# Altium footprint library ICs And Semiconductors SMD.PcbLib: 943 footprints (part 54 of 60)
Each footprint in its own frame and in the unit in brackets; x right, y up, seen from the top. Pads: shape width x height; smd on the part's side, far side on the other; paste and mask are expansions set on the pad; w line width, h text height; cw(c..) or ccw(c..) is an arc to the next point about the centre after c.
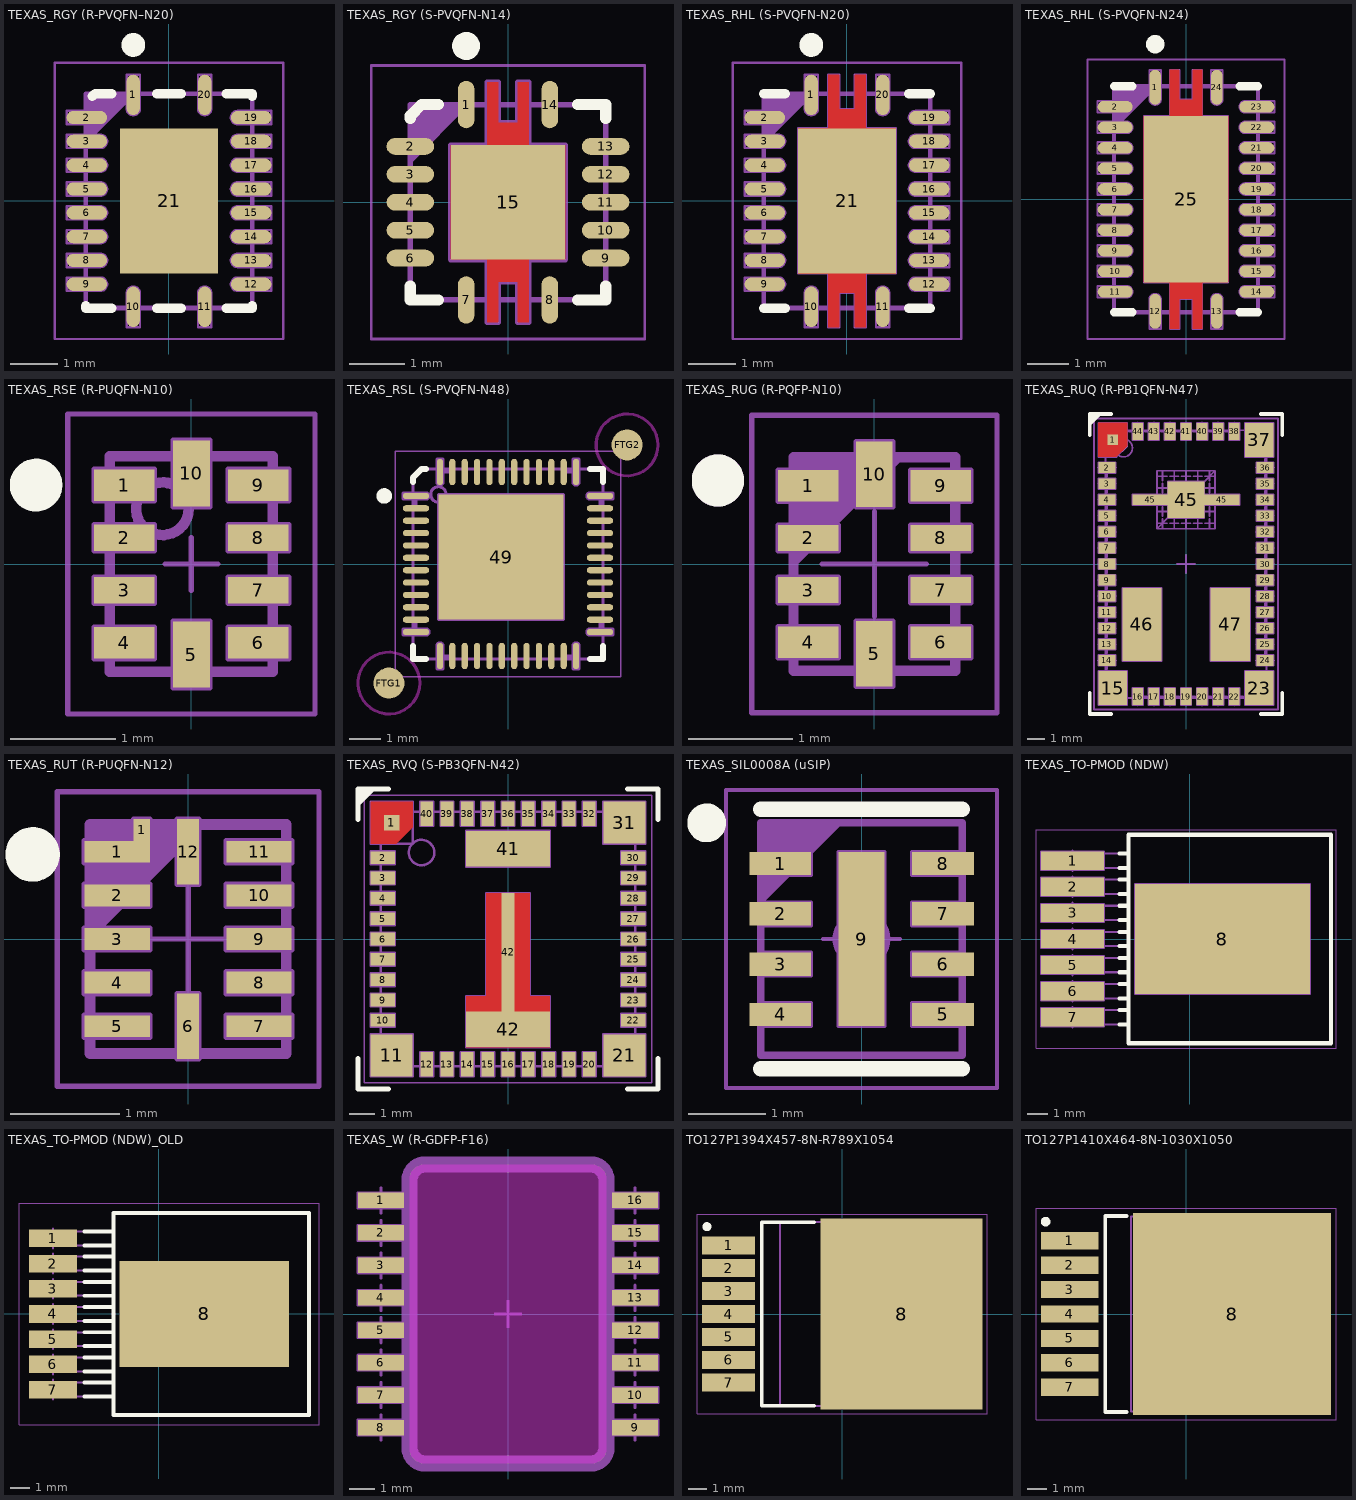
[diagram p53: the footprints below, top view; thin cyan lines are the x and y axes]

## TEXAS_RGY (R-PVQFN–N20) [mm] "TEXAS Case Style RGY (R-PVQFN–N24), QFN, 0.50mm Pitch, Rectangular; 20 Pin, 4.50mm L X 3.50mm W X 1mm H body (w/thermal tab 3.15 X 2.15mm)"
height 1
pads (21):
  oval 0.28x0.85 smd: 1(-0.75,2.225) 10(-0.75,-2.225) 11(0.75,-2.225) 20(0.75,2.225)
  oval 0.85x0.28 smd: 2(-1.725,1.75) 3(-1.725,1.25) 4(-1.725,0.75) 5(-1.725,0.25) 6(-1.725,-0.25) 7(-1.725,-0.75) 8(-1.725,-1.25) 9(-1.725,-1.75) 12(1.725,-1.75) 13(1.725,-1.25) 14(1.725,-0.75) 15(1.725,-0.25) 16(1.725,0.25) 17(1.725,0.75) 18(1.725,1.25) 19(1.725,1.75)
  rect 2.05x3.05 smd: 21(0,0)
Top Overlay:
  circle w0.25: c-0.75,3.275 r0.125
  lines w0.2: -1.75,-2.2 -1.75,-2.25 -1.2,-2.25 ; -1.61,2.2 -1.55,2.25 -1.2,2.25 ; -0.26,-2.25 0.26,-2.25 ; -0.26,2.25 0.26,2.25 ; 1.2,-2.25 1.75,-2.25 1.75,-2.2 ; 1.2,2.25 1.75,2.25 1.75,2.2
Mechanical 8:
  drawing of 164 lines, arcs and shapes, not listed
Mechanical 14:
  lines w0.1: -1.75,1.25 -0.75,2.25 ; -1.75,1.35 -0.85,2.25 ; -1.75,1.45 -0.95,2.25 ; -1.75,1.55 -1.05,2.25 ; -1.75,1.65 -1.15,2.25 ; -1.75,1.75 -1.25,2.25 ; -1.75,1.85 -1.35,2.25 ; -1.75,1.95 -1.45,2.25 ; -1.75,2.05 -1.55,2.25 ; -1.75,2.15 -1.65,2.25 ; -1.75,-2.25 -1.75,2.25 1.75,2.25 1.75,-2.25 -1.75,-2.25
Mechanical 15:
  lines w0.05: -2.4,-2.9 -2.4,2.9 2.4,2.9 2.4,-2.9 -2.4,-2.9
3D body "TEXAS_RGY (R-PVQFN–N20).stp": height 1, standoff 0, extent -1.75,-2.25 1.75,2.25

## TEXAS_RGY (S-PVQFN-N14) [mm] "PSON, JEDEC MO-241BA, TEXAS RGY (S-PVQFN–N14), 0.50mm Pitch, Square; 5 Pin X 4 Pin, 3.5mm X 3.5mm X 1.00mm H body (w/thermal tab 2.05 X 2.05mm)"
height 1
pads (15):
  oval 0.3x0.85 smd: 1(-0.75,1.75) 7(-0.75,-1.75) 8(0.75,-1.75) 14(0.75,1.75)
  oval 0.85x0.3 smd: 2(-1.75,1) 3(-1.75,0.5) 4(-1.75,0) 5(-1.75,-0.5) 6(-1.75,-1) 9(1.75,-1) 10(1.75,-0.5) 11(1.75,0) 12(1.75,0.5) 13(1.75,1)
  rect 2.05x2.05 smd: 15(0,0)
Top Layer:
  region: -1.025,1.025 -0.375,1.025 -0.375,2.15 -0.175,2.15 -0.175,1.425 0.175,1.425 0.175,2.15 0.375,2.15 0.375,1.025 1.025,1.025 1.025,-1.025 0.375,-1.025 0.375,-2.15 0.175,-2.15 0.175,-1.425 -0.175,-1.425 -0.175,-2.15 -0.375,-2.15 -0.375,-1.025 -1.025,-1.025
Top Overlay:
  circle w0.25: c-0.75,2.8 r0.125
  lines w0.2: -1.75,-1.5 -1.75,-1.75 -1.25,-1.75 ; -1.75,1.5 -1.75,1.55 -1.55,1.75 -1.25,1.75 ; 1.25,-1.75 1.75,-1.75 1.75,-1.5 ; 1.25,1.75 1.75,1.75 1.75,1.5
Mechanical 8:
  lines w0.1: -1,0 0,0 ; 0,-1 0,0 ; 0,1 0,0 ; 1,0 0,0 ; -1.025,-1.025 -1.025,1.025 -0.375,1.025 -0.375,2.15 -0.175,2.15 -0.175,1.425 0.175,1.425 0.175,2.15 0.375,2.15 0.375,1.025 1.025,1.025 1.025,-1.025 0.375,-1.025 0.375,-2.15 0.175,-2.15 0.175,-1.425 -0.175,-1.425 -0.175,-2.15 -0.375,-2.15 -0.375,-1.025 -1.025,-1.025
Mechanical 14:
  lines w0.1: -1.75,0.75 -0.75,1.75 ; -1.75,0.85 -0.85,1.75 ; -1.75,0.95 -0.95,1.75 ; -1.75,1.05 -1.05,1.75 ; -1.75,1.15 -1.15,1.75 ; -1.75,1.25 -1.25,1.75 ; -1.75,1.35 -1.35,1.75 ; -1.75,1.45 -1.45,1.75 ; -1.75,1.55 -1.55,1.75 ; -1.75,1.65 -1.65,1.75 ; -1.75,-1.75 -1.75,1.75 1.75,1.75 1.75,-1.75 -1.75,-1.75
Mechanical 15:
  lines w0.05: -0.5,0 0.5,0 ; 0,-0.5 0,0.5 ; -2.45,-2.45 -2.45,2.45 2.45,2.45 2.45,-2.45 -2.45,-2.45
3D body "TEXAS_RGY (S-PVQFN–N14).stp": height 1, standoff 0, extent -1.825,-1.825 1.825,1.825

## TEXAS_RHL (S-PVQFN-N20) [mm] "TEXAS Case Style RHL (S-PVQFN-N20), QFN, 0.50mm Pitch, Rectangular; 20 Pin, 4.50mm L X 3.50mm W X 1mm H body (w/thermal tab 3.05 X 2.05mm)"
height 1
pads (21):
  oval 0.28x0.85 smd: 1(-0.75,2.225) 10(-0.75,-2.225) 11(0.75,-2.225) 20(0.75,2.225)
  oval 0.85x0.28 smd: 2(-1.725,1.75) 3(-1.725,1.25) 4(-1.725,0.75) 5(-1.725,0.25) 6(-1.725,-0.25) 7(-1.725,-0.75) 8(-1.725,-1.25) 9(-1.725,-1.75) 12(1.725,-1.75) 13(1.725,-1.25) 14(1.725,-0.75) 15(1.725,-0.25) 16(1.725,0.25) 17(1.725,0.75) 18(1.725,1.25) 19(1.725,1.75)
  rect 2.05x3.05 smd: 21(0,0)
Top Layer:
  region: -0.39,-2.65 -0.39,-1.525 -1.025,-1.525 -1.025,1.525 -0.39,1.525 -0.39,2.65 -0.16,2.65 -0.16,1.925 0.16,1.925 0.16,2.65 0.39,2.65 0.39,1.525 1.025,1.525 1.025,-1.525 0.39,-1.525 0.39,-2.65 0.16,-2.65 0.16,-1.925 -0.16,-1.925 -0.16,-2.65
Top Overlay:
  circle w0.25: c-0.75,3.275 r0.125
  lines w0.2: -1.75,-2.25 -1.3,-2.25 ; -1.75,2.25 -1.3,2.25 ; 1.3,-2.25 1.75,-2.25 ; 1.3,2.25 1.75,2.25
Mechanical 8:
  drawing of 184 lines, arcs and shapes, not listed
Mechanical 14:
  lines w0.1: -1.75,1.25 -0.75,2.25 ; -1.75,1.35 -0.85,2.25 ; -1.75,1.45 -0.95,2.25 ; -1.75,1.55 -1.05,2.25 ; -1.75,1.65 -1.15,2.25 ; -1.75,1.75 -1.25,2.25 ; -1.75,1.85 -1.35,2.25 ; -1.75,1.95 -1.45,2.25 ; -1.75,2.05 -1.55,2.25 ; -1.75,2.15 -1.65,2.25 ; -1.75,-2.25 1.75,-2.25 1.75,2.25 -1.75,2.25 -1.75,-2.25
Mechanical 15:
  lines w0.05: -2.4,-2.9 2.4,-2.9 2.4,2.9 -2.4,2.9 -2.4,-2.9
3D body "TEXAS_RHL (S-PVQFN-N20).stp": height 1, standoff 0, extent -1.75,-2.25 1.75,2.25

## TEXAS_RHL (S-PVQFN-N24) [mm] "TEXAS Case Style RHL (S-PVQFN-N24), QFN, 0.50mm Pitch, Rectangular; 24 Pin, 5.50mm L X 3.50mm W X 1mm H body (w/thermal tab 4.05 X 2.05mm)"
height 1
pads (25):
  oval 0.28x0.85 smd: 1(-0.75,2.725) 12(-0.75,-2.725) 13(0.75,-2.725) 24(0.75,2.725)
  oval 0.85x0.28 smd: 2(-1.725,2.25) 3(-1.725,1.75) 4(-1.725,1.25) 5(-1.725,0.75) 6(-1.725,0.25) 7(-1.725,-0.25) 8(-1.725,-0.75) 9(-1.725,-1.25) 10(-1.725,-1.75) 11(-1.725,-2.25) 14(1.725,-2.25) 15(1.725,-1.75) 16(1.725,-1.25) 17(1.725,-0.75) 18(1.725,-0.25) 19(1.725,0.25) 20(1.725,0.75) 21(1.725,1.25) 22(1.725,1.75) 23(1.725,2.25)
  rect 2.05x4.05 smd: 25(0,0)
Top Layer:
  region: -0.39,-3.15 -0.39,-2.025 -1.025,-2.025 -1.025,2.025 -0.39,2.025 -0.39,3.15 -0.16,3.15 -0.16,2.425 0.16,2.425 0.16,3.15 0.39,3.15 0.39,2.025 1.025,2.025 1.025,-2.025 0.39,-2.025 0.39,-3.15 0.16,-3.15 0.16,-2.425 -0.16,-2.425 -0.16,-3.15
Top Overlay:
  circle w0.2: c-0.75,3.775 r0.125
  lines w0.2: -1.75,-2.75 -1.3,-2.75 ; -1.75,2.75 -1.3,2.75 ; -0.75,3.875 -0.75,3.775 -0.65,3.775 ; 1.3,-2.75 1.75,-2.75 ; 1.3,2.75 1.75,2.75
Mechanical 8:
  drawing of 216 lines, arcs and shapes, not listed
Mechanical 14:
  lines w0.1: -1.75,1.75 -0.75,2.75 ; -1.75,1.85 -0.85,2.75 ; -1.75,1.95 -0.95,2.75 ; -1.75,2.05 -1.05,2.75 ; -1.75,2.15 -1.15,2.75 ; -1.75,2.25 -1.25,2.75 ; -1.75,2.35 -1.35,2.75 ; -1.75,2.45 -1.45,2.75 ; -1.75,2.55 -1.55,2.75 ; -1.75,2.65 -1.65,2.75 ; -1.75,-2.75 1.75,-2.75 1.75,2.75 -1.75,2.75 -1.75,-2.75
Mechanical 15:
  lines w0.05: -2.4,-3.4 2.4,-3.4 2.4,3.4 -2.4,3.4 -2.4,-3.4
3D body "TEXAS_RHL (S-PVQFN-N24).stp": height 1, standoff 0, extent -1.75,-2.75 1.75,2.75

## TEXAS_RSE (R-PUQFN-N10) [mm] "QFN, 10-Leads, Body 1.5x2mm, Pitch 0.50mm, IPC Medium Density"
height 0.6
pads (10):
  rect 0.575x0.3 smd: 1(-0.637,0.75) 4(-0.637,-0.75) 6(0.637,-0.75) 9(0.637,0.75)
  rect 0.575x0.25 smd: 2(-0.637,0.25) 3(-0.637,-0.25) 7(0.637,-0.25) 8(0.637,0.25)
  rect 0.35x0.63 smd: 5(0,-0.86) 10(0,0.86)
Top Overlay:
  circle w0.25: c-1.475,0.75 r0.125
Mechanical 8:
  lines w0.05: -0.25,0 0,0 ; 0,-0.25 0,0 ; 0,0.25 0,0 ; 0.25,0 0,0 ; -0.925,-0.9 -0.925,-0.6 ; -0.925,-0.9 -0.35,-0.9 -0.35,-0.6 -0.925,-0.6 ; -0.925,-0.9 -0.637,-0.75 -0.925,-0.6 ; -0.925,-0.375 -0.35,-0.375 -0.35,-0.125 -0.925,-0.125 ; -0.925,-0.375 -0.925,-0.125 ; -0.925,-0.375 -0.637,-0.25 -0.925,-0.125 ; -0.925,0.125 -0.35,0.125 -0.35,0.375 -0.925,0.375 ; -0.925,0.125 -0.925,0.375 ; -0.925,0.125 -0.637,0.25 -0.925,0.375 ; -0.925,0.6 -0.925,0.9 ; -0.925,0.6 -0.35,0.6 -0.35,0.9 -0.925,0.9 ; -0.925,0.6 -0.637,0.75 -0.925,0.9 ; -0.175,-1.175 -0.175,-0.545 0.175,-0.545 0.175,-1.175 ; -0.175,-1.175 0.175,-1.175 ; -0.175,-1.175 0,-0.86 0.175,-1.175 ; -0.175,1.175 -0.175,0.545 0.175,0.545 0.175,1.175 ; -0.175,1.175 0.175,1.175 ; -0.175,1.175 0,0.86 0.175,1.175 ; 0.925,-0.9 0.925,-0.6 ; 0.925,-0.9 0.35,-0.9 0.35,-0.6 0.925,-0.6 ; 0.925,-0.9 0.637,-0.75 0.925,-0.6 ; 0.925,-0.375 0.925,-0.125 ; 0.925,-0.375 0.35,-0.375 0.35,-0.125 0.925,-0.125 ; 0.925,-0.375 0.925,-0.125 ; 0.925,-0.375 0.637,-0.25 0.925,-0.125 ; 0.925,0.125 0.925,0.375 ; 0.925,0.125 0.35,0.125 0.35,0.375 0.925,0.375 ; 0.925,0.125 0.925,0.375 ; 0.925,0.125 0.637,0.25 0.925,0.375 ; 0.925,0.6 0.925,0.9 ; 0.925,0.6 0.35,0.6 0.35,0.9 0.925,0.9 ; 0.925,0.6 0.637,0.75 0.925,0.9
Mechanical 14:
  circle w0.1: c-0.275,0.525 r0.25
  lines w0.1: -0.775,-1.025 0.775,-1.025 0.775,1.025 -0.775,1.025 -0.775,-1.025
Mechanical 15:
  lines w0.05: -1.175,-1.425 -1.175,1.425 1.175,1.425 1.175,-1.425 -1.175,-1.425
3D body "TEXAS_RSE (R-PUQFN-N10).stp": height 0.6, standoff 0, extent -0.775,-1.025 0.775,1.025

## TEXAS_RSL (S-PVQFN-N48) [mm] "TEXAS Case Style RSL, QFN, 0.40mm Pitch, Square; 48 Pin, 6.00mm L X 6.00mm W X 1.00mm H body (w/thermal tab 4.05 X 4.05mm)"
height 1
pads (51):
  oval 0.85x0.2 smd: 1(-2.975,2.2) 2(-2.975,1.8) 3(-2.975,1.4) 4(-2.975,1) 5(-2.975,0.6) 6(-2.975,0.2) 7(-2.975,-0.2) 8(-2.975,-0.6) 9(-2.975,-1) 10(-2.975,-1.4) 11(-2.975,-1.8) 12(-2.975,-2.2) 25(2.975,-2.2) 26(2.975,-1.8) 27(2.975,-1.4) 28(2.975,-1) 29(2.975,-0.6) 30(2.975,-0.2) 31(2.975,0.2) 32(2.975,0.6) 33(2.975,1) 34(2.975,1.4) 35(2.975,1.8) 36(2.975,2.2)
  oval 0.2x0.85 smd: 13(-2.2,-2.975) 14(-1.8,-2.975) 15(-1.4,-2.975) 16(-1,-2.975) 17(-0.6,-2.975) 18(-0.2,-2.975) 19(0.2,-2.975) 20(0.6,-2.975) 21(1,-2.975) 22(1.4,-2.975) 23(1.8,-2.975) 24(2.2,-2.975) 37(2.2,2.975) 38(1.8,2.975) 39(1.4,2.975) 40(1,2.975) 41(0.6,2.975) 42(0.2,2.975) 43(-0.2,2.975) 44(-0.6,2.975) 45(-1,2.975) 46(-1.4,2.975) 47(-1.8,2.975) 48(-2.2,2.975)
  rect 4.05x4.05 smd: 49(-0.225,0.225)
  round 1 smd paste-0.51 mask+0.5: FTG1(-3.85,-3.85) FTG2(3.85,3.85)
Top Layer keep-out:
  circle w0.1: c-3.85,-3.85 r1
  circle w0.1: c3.85,3.85 r1
Top Overlay:
  circle w0.25: c-4,2.2 r0.125
  lines w0.2: -3.075,-2.65 -3.075,-3.075 -2.65,-3.075 ; -3.075,2.65 -3.075,2.795 -2.795,3.075 -2.65,3.075 ; 2.65,-3.075 3.075,-3.075 3.075,-2.65 ; 2.65,3.075 3.075,3.075 3.075,2.65
Top Paste:
  region: 0.65,1.1 0.65,2.25 1.8,2.25 1.8,1.1
  region: 0.65,-0.35 0.65,0.8 1.8,0.8 1.8,-0.35
  region: 0.65,-1.8 0.65,-0.65 1.8,-0.65 1.8,-1.8
  region: -0.8,-1.8 -0.8,-0.65 0.35,-0.65 0.35,-1.8
  region: -2.25,-1.8 -2.25,-0.65 -1.1,-0.65 -1.1,-1.8
  region: -2.25,-0.35 -2.25,0.8 -1.1,0.8 -1.1,-0.35
  region: -0.8,-0.35 -0.8,0.8 0.35,0.8 0.35,-0.35
  region: -0.8,1.1 -0.8,2.25 0.35,2.25 0.35,1.1
  region: -2.25,1.1 -2.25,2.25 -1.1,2.25 -1.1,1.1
Mechanical 8:
  lines w0.1: -3.4,-2.2 -2.975,-2.2 ; -3.4,2.2 -2.975,2.2 ; -2.975,-1.8 -2.975,-2.2 ; -2.975,1.8 -2.975,2.2 ; -2.55,-2.2 -2.975,-2.2 ; -2.55,2.2 -2.975,2.2 ; -2.2,-3.4 -2.2,-2.975 ; -2.2,-2.55 -2.2,-2.975 ; -2.2,2.55 -2.2,2.975 ; -2.2,3.4 -2.2,2.975 ; -2.079,-1.629 -1.725,-1.275 ; -2.079,-0.921 -1.725,-1.275 ; -2.079,-0.629 -1.725,-0.275 ; -2.079,0.079 -1.725,-0.275 ; -2.079,0.371 -1.725,0.725 ; -2.079,1.079 -1.725,0.725 ; -2.079,1.371 -1.725,1.725 ; -2.079,2.079 -1.725,1.725 ; -1.8,-2.975 -2.2,-2.975 ; -1.8,2.975 -2.2,2.975 ; -1.371,-1.629 -1.725,-1.275 ; -1.371,-0.921 -1.725,-1.275 ; -1.371,-0.629 -1.725,-0.275 ; -1.371,0.079 -1.725,-0.275 ; -1.371,0.371 -1.725,0.725 ; -1.371,1.079 -1.725,0.725 ; -1.371,1.371 -1.725,1.725 ; -1.371,2.079 -1.725,1.725 ; -1.079,-1.629 -0.725,-1.275 ; -1.079,-0.921 -0.725,-1.275 ; -1.079,-0.629 -0.725,-0.275 ; -1.079,0.079 -0.725,-0.275 ; -1.079,0.371 -0.725,0.725 ; -1.079,1.079 -0.725,0.725 ; -1.079,1.371 -0.725,1.725 ; -1.079,2.079 -0.725,1.725 ; -0.725,0.225 -0.225,0.225 -0.225,0.725 ; -0.5,0 0,0 ; -0.371,-1.629 -0.725,-1.275 ; -0.371,-0.921 -0.725,-1.275 ; -0.371,-0.629 -0.725,-0.275 ; -0.371,1.079 -0.725,0.725 ; -0.371,1.371 -0.725,1.725 ; -0.371,2.079 -0.725,1.725 ; -0.079,-1.629 0.275,-1.275 ; -0.079,-0.921 0.275,-1.275 ; -0.079,-0.629 0.275,-0.275 ; -0.079,1.079 0.275,0.725 ; -0.079,1.371 0.275,1.725 ; -0.079,2.079 0.275,1.725 ; 0,-0.5 0,0 ; 0,0.5 0,0 ; 0.5,0 0,0 ; 0.629,-1.629 0.275,-1.275 ; 0.629,-0.921 0.275,-1.275 ; 0.629,-0.629 0.275,-0.275 ; 0.629,0.079 0.275,-0.275 ; 0.629,0.371 0.275,0.725 ; 0.629,1.079 0.275,0.725 ; 0.629,1.371 0.275,1.725 ; 0.629,2.079 0.275,1.725 ; 0.921,-1.629 1.275,-1.275 ; 0.921,-0.921 1.275,-1.275 ; 0.921,-0.629 1.275,-0.275 ; 0.921,0.079 1.275,-0.275 ; 0.921,0.371 1.275,0.725 ; 0.921,1.079 1.275,0.725 ; 0.921,1.371 1.275,1.725 ; 0.921,2.079 1.275,1.725 ; 1.629,-1.629 1.275,-1.275 ; 1.629,-0.921 1.275,-1.275 ; 1.629,-0.629 1.275,-0.275 ; 1.629,0.079 1.275,-0.275 ; 1.629,0.371 1.275,0.725 ; 1.629,1.079 1.275,0.725 ; 1.629,1.371 1.275,1.725 ; 1.629,2.079 1.275,1.725 ; 1.8,-2.975 2.2,-2.975 ; 1.8,2.975 2.2,2.975 ; 2.2,-3.4 2.2,-2.975 ; 2.2,-2.55 2.2,-2.975 ; 2.2,2.55 2.2,2.975 ; 2.2,3.4 2.2,2.975 ; 2.55,-2.2 2.975,-2.2 ; 2.55,2.2 2.975,2.2 ; 2.975,-1.8 2.975,-2.2 ; 2.975,1.8 2.975,2.2 ; 3.4,-2.2 2.975,-2.2 ; 3.4,2.2 2.975,2.2 ; -3.4,-2.3 -2.65,-2.3 ccw(c-2.65,-2.2) -2.65,-2.1 -3.4,-2.1 -3.4,-2.3 ; -3.4,2.1 -3.4,2.3 -2.65,2.3 cw(c-2.65,2.2) -2.65,2.1 -3.4,2.1 ; -2.3,-3.4 -2.1,-3.4 -2.1,-2.65 ccw(c-2.2,-2.65) -2.3,-2.65 -2.3,-3.4 ; -2.3,2.65 ccw(c-2.2,2.65) -2.1,2.65 -2.1,3.4 -2.3,3.4 -2.3,2.65 ; -2.25,-1.8 -2.25,2.25 1.8,2.25 1.8,-1.8 -2.25,-1.8 ; 2.1,-3.4 2.3,-3.4 2.3,-2.65 ccw(c2.2,-2.65) 2.1,-2.65 2.1,-3.4 ; 2.1,2.65 ccw(c2.2,2.65) 2.3,2.65 2.3,3.4 2.1,3.4 2.1,2.65 ; 2.65,-2.3 cw(c2.65,-2.2) 2.65,-2.1 3.4,-2.1 3.4,-2.3 2.65,-2.3 ; 2.65,2.1 cw(c2.65,2.2) 2.65,2.3 3.4,2.3 3.4,2.1 2.65,2.1
Mechanical 14:
  circle w0.1: c-2.25,2.25 r0.25
  lines w0.1: -3.075,-3.075 3.075,-3.075 3.075,3.075 -2.795,3.075 -3.075,2.795 -3.075,-3.075
Mechanical 15:
  lines w0.05: -3.65,-3.65 -3.65,3.65 3.65,3.65 3.65,-3.65 -3.65,-3.65
3D body "TEXAS_RSL (S-PVQFN-N48).stp": height 1, standoff 0, extent -3.075,-3.075 3.075,3.075

## TEXAS_RUG (R-PQFP-N10) [mm] "QFN, 0.50mm Pitch, Rect.;10 Pin, 1.50mm L X 2.00mm W X 0.40mm H Body, IPC Medium Density"
height 0.4
pads (10):
  rect 0.58x0.3 smd: 1(-0.635,0.75) 4(-0.635,-0.75) 6(0.635,-0.75) 9(0.635,0.75)
  rect 0.58x0.25 smd: 2(-0.635,0.25) 3(-0.635,-0.25) 7(0.635,-0.25) 8(0.635,0.25)
  rect 0.35x0.63 smd: 5(0,-0.86) 10(0,0.86)
Top Overlay:
  circle w0.25: c-1.5,0.8 r0.125
Mechanical 8:
  lines w0.05: -0.5,0 0,0 ; 0,-0.5 0,0 ; 0,0.5 0,0 ; 0.5,0 0,0 ; -0.925,-0.9 -0.345,-0.9 -0.345,-0.6 -0.925,-0.6 ; -0.925,-0.9 -0.925,-0.6 ; -0.925,-0.9 -0.635,-0.75 -0.925,-0.6 ; -0.925,-0.375 -0.345,-0.375 -0.345,-0.125 -0.925,-0.125 ; -0.925,-0.375 -0.925,-0.125 ; -0.925,-0.375 -0.635,-0.25 -0.925,-0.125 ; -0.925,0.125 -0.345,0.125 -0.345,0.375 -0.925,0.375 ; -0.925,0.125 -0.925,0.375 ; -0.925,0.125 -0.635,0.25 -0.925,0.375 ; -0.925,0.6 -0.345,0.6 -0.345,0.9 -0.925,0.9 ; -0.925,0.6 -0.925,0.9 ; -0.925,0.6 -0.635,0.75 -0.925,0.9 ; -0.175,-1.175 0.175,-1.175 ; -0.175,-1.175 -0.175,-0.545 0.175,-0.545 0.175,-1.175 ; -0.175,-1.175 0,-0.86 0.175,-1.175 ; -0.175,1.175 0.175,1.175 ; -0.175,1.175 -0.175,0.545 0.175,0.545 0.175,1.175 ; -0.175,1.175 0,0.86 0.175,1.175 ; 0.925,-0.9 0.925,-0.6 ; 0.925,-0.9 0.345,-0.9 0.345,-0.6 0.925,-0.6 ; 0.925,-0.9 0.635,-0.75 0.925,-0.6 ; 0.925,-0.375 0.925,-0.125 ; 0.925,-0.375 0.345,-0.375 0.345,-0.125 0.925,-0.125 ; 0.925,-0.375 0.635,-0.25 0.925,-0.125 ; 0.925,0.125 0.925,0.375 ; 0.925,0.125 0.345,0.125 0.345,0.375 0.925,0.375 ; 0.925,0.125 0.635,0.25 0.925,0.375 ; 0.925,0.6 0.925,0.9 ; 0.925,0.6 0.345,0.6 0.345,0.9 0.925,0.9 ; 0.925,0.6 0.635,0.75 0.925,0.9
Mechanical 14:
  circle w0.1: c-1.5,0.8 r0.2
  lines w0.1: -0.775,0.025 0.225,1.025 ; -0.775,0.125 0.125,1.025 ; -0.775,0.225 0.025,1.025 ; -0.775,0.325 -0.075,1.025 ; -0.775,0.425 -0.175,1.025 ; -0.775,0.525 -0.275,1.025 ; -0.775,0.625 -0.375,1.025 ; -0.775,0.725 -0.475,1.025 ; -0.775,0.825 -0.575,1.025 ; -0.775,0.925 -0.675,1.025 ; -0.775,-1.025 -0.775,1.025 0.775,1.025 0.775,-1.025 -0.775,-1.025
Mechanical 15:
  lines w0.05: -1.175,-1.425 -1.175,1.425 1.175,1.425 1.175,-1.425 -1.175,-1.425
3D body "TEXAS_RUG (R-PQFP-N10).stp": height 0.4, standoff 0, extent -0.775,-1.025 0.775,1.025

## TEXAS_RUQ (R-PB1QFN-N47) [mm] "TEXAS Case Style B1QFN, QFN, 0.90mm Pitch, Square; 47 Pin, 15.00mm L X 6mm W X 9mm H body (w/thermal tab 1.95 X 5.9mm + 2 x 4 X 2.1mm )"
height 2.9
pads (49):
  rect 0.6x0.6 smd paste-0.3 mask-0.3: 1(-4.1,6.95)
  rect 0.95x0.6 smd: 2(-4.425,5.4) 3(-4.425,4.5) 4(-4.425,3.6) 5(-4.425,2.7) 6(-4.425,1.8) 7(-4.425,0.9) 8(-4.425,0) 9(-4.425,-0.9) 10(-4.425,-1.8) 11(-4.425,-2.7) 12(-4.425,-3.6) 13(-4.425,-4.5) 14(-4.425,-5.4) 24(4.425,-5.4) 25(4.425,-4.5) 26(4.425,-3.6) 27(4.425,-2.7) 28(4.425,-1.8) 29(4.425,-0.9) 30(4.425,0) 31(4.425,0.9) 32(4.425,1.8) 33(4.425,2.7) 34(4.425,3.6) 35(4.425,4.5) 36(4.425,5.4)
  rect 1.6x1.9 smd: 15(-4.1,-6.95) 23(4.1,-6.95) 37(4.1,6.95)
  rect 0.6x0.95 smd: 16(-2.7,-7.425) 17(-1.8,-7.425) 18(-0.9,-7.425) 19(0,-7.425) 20(0.9,-7.425) 21(1.8,-7.425) 22(2.7,-7.425) 38(2.7,7.425) 39(1.8,7.425) 40(0.9,7.425) 41(0,7.425) 42(-0.9,7.425) 43(-1.8,7.425) 44(-2.7,7.425)
  rect 1.975x0.6 smd: 45(-2.013,3.6) 45(2.013,3.6)
  rect 2.05x2.05 smd: 45(0,3.6)
  rect 2.2x4.1 smd: 46(-2.47,-3.38) 47(2.48,-3.38)
Top Layer:
  region: -4.9,6 -3.9,6 -3.3,6.6 -3.3,7.9 -4.9,7.9
Top Overlay:
  lines w0.2: -5.4,-7.2 -5.4,-8.4 -4.2,-8.4 ; -5.4,7.2 -5.4,8.4 -4.2,8.4 ; -5.4,7.824 -4.824,8.4 ; -5.4,8.107 -5.107,8.4 ; 4.2,-8.4 5.4,-8.4 5.4,-7.2 ; 4.2,8.4 5.4,8.4 5.4,7.2
Mechanical 8:
  drawing of 415 lines, arcs and shapes, not listed
Mechanical 14:
  circle w0.1: c-3.5,6.5 r0.5
  lines w0.1: -4.5,-7.5 4.5,-7.5 4.5,7.474 -4.5,7.5 -4.5,-7.5
Mechanical 15:
  lines w0.1: -5.15,-8.15 5.15,-8.15 5.15,8.15 -5.15,8.15 -5.15,-8.15
3D body "TEXAS_RUQ (R-PB1QFN-N47).stp": height 2.9, standoff 0, extent -4.5,-7.5 4.5,7.5

## TEXAS_RUT (R-PUQFN-N12) [mm] "SON, TEXAS RUT (R-PUQFN-N12), 0.50mm Pitch, 12-pin, 1.70mm W  X 2.00mm L X 0.55mm Height"
height 0.55
pads (13):
  rect 0.6x0.2 smd: 1(-0.65,0.8) 2(-0.65,0.4) 3(-0.65,0) 4(-0.65,-0.4) 5(-0.65,-0.8) 7(0.65,-0.8) 8(0.65,-0.4) 9(0.65,0) 10(0.65,0.4) 11(0.65,0.8)
  rect 0.15x0.2 smd: 1(-0.425,1)
  rect 0.2x0.6 smd: 6(0,-0.8) 12(0,0.8)
Top Overlay:
  circle w0.25: c-1.425,0.775 r0.125
Mechanical 8:
  lines w0.05: -0.5,0 0,0 ; 0,-0.5 0,0 ; 0,0.5 0,0 ; 0.5,0 0,0 ; -0.95,-0.9 -0.35,-0.9 -0.35,-0.7 -0.95,-0.7 ; -0.95,-0.9 -0.95,-0.7 ; -0.95,-0.9 -0.65,-0.8 -0.95,-0.7 ; -0.95,-0.5 -0.35,-0.5 -0.35,-0.3 -0.95,-0.3 ; -0.95,-0.5 -0.95,-0.3 ; -0.95,-0.5 -0.65,-0.4 -0.95,-0.3 ; -0.95,-0.1 -0.35,-0.1 -0.35,0.1 -0.95,0.1 ; -0.95,-0.1 -0.95,0.1 ; -0.95,-0.1 -0.65,0 -0.95,0.1 ; -0.95,0.3 -0.35,0.3 -0.35,0.5 -0.95,0.5 ; -0.95,0.3 -0.95,0.5 ; -0.95,0.3 -0.65,0.4 -0.95,0.5 ; -0.95,0.7 -0.35,0.7 -0.35,0.9 -0.35,1.1 ; -0.95,0.7 -0.95,0.9 ; -0.95,0.7 -0.65,0.8 -0.95,0.9 ; -0.95,0.9 -0.5,0.9 -0.5,1.1 ; -0.5,1.1 -0.425,1 -0.35,1.1 ; -0.5,1.1 -0.35,1.1 ; -0.1,-1.1 0,-0.8 0.1,-1.1 ; -0.1,-1.1 0.1,-1.1 ; -0.1,-1.1 -0.1,-0.5 0.1,-0.5 0.1,-1.1 ; -0.1,1.1 0,0.8 0.1,1.1 ; -0.1,1.1 0.1,1.1 ; -0.1,1.1 -0.1,0.5 0.1,0.5 0.1,1.1 ; 0.95,-0.9 0.65,-0.8 0.95,-0.7 ; 0.95,-0.9 0.95,-0.7 ; 0.95,-0.9 0.35,-0.9 0.35,-0.7 0.95,-0.7 ; 0.95,-0.5 0.65,-0.4 0.95,-0.3 ; 0.95,-0.5 0.95,-0.3 ; 0.95,-0.5 0.35,-0.5 0.35,-0.3 0.95,-0.3 ; 0.95,-0.1 0.65,0 0.95,0.1 ; 0.95,-0.1 0.95,0.1 ; 0.95,-0.1 0.35,-0.1 0.35,0.1 0.95,0.1 ; 0.95,0.3 0.65,0.4 0.95,0.5 ; 0.95,0.3 0.95,0.5 ; 0.95,0.3 0.35,0.3 0.35,0.5 0.95,0.5 ; 0.95,0.7 0.65,0.8 0.95,0.9 ; 0.95,0.7 0.95,0.9 ; 0.95,0.7 0.35,0.7 0.35,0.9 0.95,0.9
Mechanical 14:
  lines w0.1: -0.9,0.05 0.1,1.05 ; -0.9,0.15 0,1.05 ; -0.9,0.25 -0.1,1.05 ; -0.9,0.35 -0.2,1.05 ; -0.9,0.45 -0.3,1.05 ; -0.9,0.55 -0.4,1.05 ; -0.9,0.65 -0.5,1.05 ; -0.9,0.75 -0.6,1.05 ; -0.9,0.85 -0.7,1.05 ; -0.9,0.95 -0.8,1.05 ; -0.9,-1.05 -0.9,1.05 0.9,1.05 0.9,-1.05 -0.9,-1.05
Mechanical 15:
  lines w0.05: -1.2,-1.35 -1.2,1.35 1.2,1.35 1.2,-1.35 -1.2,-1.35
3D body "TEXAS_RUT (R-PUQFN-N12).stp": height 0.55, standoff 0, extent -0.9,-1.05 0.9,1.05

## TEXAS_RVQ (S-PB3QFN-N42) [mm] "TEXAS Case Style B3QFN, QFN, 0.80mm Pitch, Square; 42 Pin, 10mm L X 10mm W X 4.4mm H body (w/thermal tab 5.95 X 3.19mm + 1.3 X 3.19mm )"
height 4.4
pads (43):
  rect 0.6x0.6 smd paste-0.3 mask-0.3: 1(-4.575,4.575)
  rect 0.95x0.5 smd: 2(-4.925,3.2) 3(-4.925,2.4) 4(-4.925,1.6) 5(-4.925,0.8) 6(-4.925,0) 7(-4.925,-0.8) 8(-4.925,-1.6) 9(-4.925,-2.4) 10(-4.925,-3.2) 22(4.925,-3.2) 23(4.925,-2.4) 24(4.925,-1.6) 25(4.925,-0.8) 26(4.925,0) 27(4.925,0.8) 28(4.925,1.6) 29(4.925,2.4) 30(4.925,3.2)
  rect 1.65x1.65 smd: 11(-4.575,-4.575) 21(4.575,-4.575) 31(4.575,4.575)
  rect 0.5x0.95 smd: 12(-3.2,-4.925) 13(-2.4,-4.925) 14(-1.6,-4.925) 15(-0.8,-4.925) 16(0,-4.925) 17(0.8,-4.925) 18(1.6,-4.925) 19(2.4,-4.925) 20(3.2,-4.925) 32(3.2,4.925) 33(2.4,4.925) 34(1.6,4.925) 35(0.8,4.925) 36(0,4.925) 37(-0.8,4.925) 38(-1.6,4.925) 39(-2.4,4.925) 40(-3.2,4.925)
  rect 3.29x1.4 smd: 41(0,3.55) 42(0,-3.55)
  rect 0.525x4.65 smd: 42(0,-0.525)
Top Layer:
  region: -5.4,3.75 -4.4,3.75 -3.75,4.4 -3.75,5.4 -5.4,5.4
  region: -1.645,-2.25 -0.863,-2.25 -0.863,1.8 0.863,1.8 0.862,-2.25 1.645,-2.25 1.645,-4.25 -1.645,-4.25
Top Overlay:
  lines w0.2: -5.9,-4.7 -5.9,-5.9 -4.7,-5.9 ; -5.9,4.7 -5.9,5.9 -4.7,5.9 ; -5.9,5.324 -5.324,5.9 ; -5.9,5.607 -5.607,5.9 ; 4.7,-5.9 5.9,-5.9 5.9,-4.7 ; 4.7,5.9 5.9,5.9 5.9,4.7
Mechanical 8:
  drawing of 336 lines, arcs and shapes, not listed
Mechanical 14:
  circle w0.1: c-3.4,3.4 r0.5
  lines w0.1: -5,-5 5,-5 5,5 -5,5 -5,-5
Mechanical 15:
  lines w0.05: -0.5,0 0,0 ; 0,-0.5 0,0 ; 0,0.5 0,0 ; 0.5,0 0,0 ; -5.65,-5.65 5.65,-5.65 5.65,5.65 -5.65,5.65 -5.65,-5.65
3D body "TEXAS_RVQ (S-PB3QFN-N42).stp": height 4.4, standoff 0, extent -5,-5 5,5

## TEXAS_SIL0008A (uSIP) [mm] "uSIP 9 Pin Package, TEXAS Package SIL0008A, 0.65mm pitch; 2.6mm L X 3.0mm W X 1.5mm H body"
height 1.5
pads (9):
  rect 0.8x0.3 smd: 1(-1.05,0.975) 2(-1.05,0.325) 3(-1.05,-0.325) 4(-1.05,-0.975) 5(1.05,-0.975) 6(1.05,-0.325) 7(1.05,0.325) 8(1.05,0.975)
  rect 0.6x2.25 smd: 9(0,0)
Top Overlay:
  circle w0.25: c-2,1.5 r0.125
  lines w0.2: -1.3,-1.675 1.3,-1.675 ; -1.3,1.675 1.3,1.675
Mechanical 8:
  lines w0.05: -0.5,0 0,0 ; 0,-0.5 0,0 ; 0,0.5 0,0 ; 0.5,0 0,0 ; -1.25,-1.125 -1.25,-0.825 ; -1.25,-1.125 -0.65,-1.125 -0.65,-0.825 -1.25,-0.825 ; -1.25,-1.125 -0.95,-0.975 -1.25,-0.825 ; -1.25,-0.475 -1.25,-0.175 ; -1.25,-0.475 -0.65,-0.475 -0.65,-0.175 -1.25,-0.175 ; -1.25,-0.475 -0.95,-0.325 -1.25,-0.175 ; -1.25,0.175 -1.25,0.475 ; -1.25,0.175 -0.65,0.175 -0.65,0.475 -1.25,0.475 ; -1.25,0.175 -0.95,0.325 -1.25,0.475 ; -1.25,0.825 -1.25,1.125 ; -1.25,0.825 -0.65,0.825 -0.65,1.125 -1.25,1.125 ; -1.25,0.825 -0.95,0.975 -1.25,1.125 ; -0.3,1.125 0.3,1.125 ; -0.3,1.125 -0.3,-1.125 0.3,-1.125 0.3,1.125 ; -0.3,1.125 0,0 ; 0,0 0.3,1.125 ; 1.25,-1.125 1.25,-0.825 ; 1.25,-1.125 0.65,-1.125 0.65,-0.825 1.25,-0.825 ; 1.25,-1.125 0.95,-0.975 1.25,-0.825 ; 1.25,-0.475 1.25,-0.175 ; 1.25,-0.475 0.65,-0.475 0.65,-0.175 1.25,-0.175 ; 1.25,-0.475 0.95,-0.325 1.25,-0.175 ; 1.25,0.175 1.25,0.475 ; 1.25,0.175 0.65,0.175 0.65,0.475 1.25,0.475 ; 1.25,0.175 0.95,0.325 1.25,0.475 ; 1.25,0.825 1.25,1.125 ; 1.25,0.825 0.65,0.825 0.65,1.125 1.25,1.125 ; 1.25,0.825 0.95,0.975 1.25,1.125
Mechanical 14:
  lines w0.1: -1.3,0.5 -0.3,1.5 ; -1.3,0.6 -0.4,1.5 ; -1.3,0.7 -0.5,1.5 ; -1.3,0.8 -0.6,1.5 ; -1.3,0.9 -0.7,1.5 ; -1.3,1 -0.8,1.5 ; -1.3,1.1 -0.9,1.5 ; -1.3,1.2 -1,1.5 ; -1.3,1.3 -1.1,1.5 ; -1.3,1.4 -1.2,1.5 ; -1.3,-1.5 -1.3,1.5 1.3,1.5 1.3,-1.5 -1.3,-1.5
Mechanical 15:
  circle w0.05: c0,0 r0.35
  lines w0.05: -0.5,0 0.5,0 ; 0,-0.5 0,0.5 ; -1.75,-1.925 -1.75,1.925 1.75,1.925 1.75,-1.925 -1.75,-1.925
3D body "TEXAS_SIL0008A (uSIP).stp": height 1.5, standoff 0, extent -1.3,-1.5 1.3,1.5

## TEXAS_TO-PMOD (NDW) [mm] "TEXAS Package TO-PMOD (NDW), 1.27mm pitch; 9.85mm X 10.16mm X4.57m body"
height 4.57
pads (8):
  rect 3.06x0.89 smd: 1(-5.7,3.81) 2(-5.7,2.54) 3(-5.7,1.27) 4(-5.7,0) 5(-5.7,-1.27) 6(-5.7,-2.54) 7(-5.7,-3.81)
  rect 8.54x5.35 smd: 8(1.605,0)
Top Overlay:
  lines w0.2: -3.415,-4.16 -2.965,-4.16 ; -3.415,-3.46 -2.965,-3.46 ; -3.415,-2.89 -2.965,-2.89 ; -3.415,-2.19 -2.965,-2.19 ; -3.415,-1.62 -2.965,-1.62 ; -3.415,-0.92 -2.965,-0.92 ; -3.415,-0.35 -2.965,-0.35 ; -3.415,0.35 -2.965,0.35 ; -3.415,0.92 -2.965,0.92 ; -3.415,1.62 -2.965,1.62 ; -3.415,2.19 -2.965,2.19 ; -3.415,2.89 -2.965,2.89 ; -3.415,3.46 -2.965,3.46 ; -3.415,4.16 -2.965,4.16 ; -2.965,-5.08 -2.965,5.08 6.885,5.08 6.885,-5.08 -2.965,-5.08
Mechanical 8:
  lines w0.1: -6.2,-3.81 -5.7,-3.81 ; -6.2,-2.54 -5.7,-2.54 ; -6.2,-1.27 -5.7,-1.27 ; -6.2,0 -5.7,0 ; -6.2,1.27 -5.7,1.27 ; -6.2,2.54 -5.7,2.54 ; -6.2,3.81 -5.7,3.81 ; -5.7,-4.31 -5.7,-3.81 ; -5.7,-3.31 -5.7,-3.81 ; -5.7,-3.04 -5.7,-2.54 ; -5.7,-2.04 -5.7,-2.54 ; -5.7,-1.77 -5.7,-1.27 ; -5.7,-0.77 -5.7,-1.27 ; -5.7,-0.5 -5.7,0 ; -5.7,0.5 -5.7,0 ; -5.7,0.77 -5.7,1.27 ; -5.7,1.77 -5.7,1.27 ; -5.7,2.04 -5.7,2.54 ; -5.7,3.04 -5.7,2.54 ; -5.7,3.31 -5.7,3.81 ; -5.7,4.31 -5.7,3.81 ; -5.2,-3.81 -5.7,-3.81 ; -5.2,-2.54 -5.7,-2.54 ; -5.2,-1.27 -5.7,-1.27 ; -5.2,0 -5.7,0 ; -5.2,1.27 -5.7,1.27 ; -5.2,2.54 -5.7,2.54 ; -5.2,3.81 -5.7,3.81 ; -0.354,-0.354 0,0 ; -0.354,0.354 0,0 ; 0.354,-0.354 0,0 ; 0.354,0.354 0,0 ; 1.105,0 1.605,0 ; 1.605,-0.5 1.605,0 ; 1.605,0.5 1.605,0 ; 2.105,0 1.605,0 ; -7.23,-4.255 -7.23,-3.365 -4.17,-3.365 -4.17,-4.255 -7.23,-4.255 ; -7.23,-2.985 -7.23,-2.095 -4.17,-2.095 -4.17,-2.985 -7.23,-2.985 ; -7.23,-1.715 -7.23,-0.825 -4.17,-0.825 -4.17,-1.715 -7.23,-1.715 ; -7.23,-0.445 -7.23,0.445 -4.17,0.445 -4.17,-0.445 -7.23,-0.445 ; -7.23,0.825 -7.23,1.715 -4.17,1.715 -4.17,0.825 -7.23,0.825 ; -7.23,2.095 -7.23,2.985 -4.17,2.985 -4.17,2.095 -7.23,2.095 ; -7.23,3.365 -7.23,4.255 -4.17,4.255 -4.17,3.365 -7.23,3.365 ; -2.665,-2.675 -2.665,2.675 5.875,2.675 5.875,-2.675 -2.665,-2.675
Mechanical 14:
  lines w0.1: -2.965,-4.16 -6.885,-4.16 -6.885,-3.46 -2.965,-3.46 ; -2.965,-2.89 -6.885,-2.89 -6.885,-2.19 -2.965,-2.19 ; -2.965,-1.62 -6.885,-1.62 -6.885,-0.92 -2.965,-0.92 ; -2.965,-0.35 -6.885,-0.35 -6.885,0.35 -2.965,0.35 ; -2.965,0.92 -6.885,0.92 -6.885,1.62 -2.965,1.62 ; -2.965,2.19 -6.885,2.19 -6.885,2.89 -2.965,2.89 ; -2.965,3.46 -6.885,3.46 -6.885,4.16 -2.965,4.16 ; -2.965,-5.08 -2.965,5.08 6.885,5.08 6.885,-5.08 -2.965,-5.08
Mechanical 15:
  lines w0.05: -7.48,-5.33 -7.48,5.33 7.135,5.33 7.135,-5.33 -7.48,-5.33
3D body "TEXAS_TO-PMOD (NDW).stp": height 4.77, standoff 0, extent -6.885,-5.08 6.885,5.08

## TEXAS_TO-PMOD (NDW)_OLD [mm] "TEXAS Package TO-PMOD (NDW), 1.27mm pitch; 9.85mm X 10.16mm X4.57m body"
height 4.57
pads (8):
  rect 2.41x0.89 smd: 1(-5.339,3.81) 2(-5.339,2.54) 3(-5.339,1.27) 4(-5.339,0) 5(-5.339,-1.27) 6(-5.339,-2.54) 7(-5.339,-3.81)
  rect 8.54x5.35 smd: 8(2.291,0)
Top Overlay:
  lines w0.2: -3.734,-4.16 -2.279,-4.16 ; -3.734,-3.46 -2.279,-3.46 ; -3.734,-2.89 -2.279,-2.89 ; -3.734,-2.19 -2.279,-2.19 ; -3.734,-1.62 -2.279,-1.62 ; -3.734,-0.92 -2.279,-0.92 ; -3.734,-0.35 -2.279,-0.35 ; -3.734,0.35 -2.279,0.35 ; -3.734,0.92 -2.279,0.92 ; -3.734,1.62 -2.279,1.62 ; -3.734,2.19 -2.279,2.19 ; -3.734,2.89 -2.279,2.89 ; -3.734,3.46 -2.279,3.46 ; -3.734,4.16 -2.279,4.16 ; -2.279,-5.08 7.571,-5.08 7.571,5.08 -2.279,5.08 -2.279,-5.08
Mechanical 8:
  lines w0.1: -5.839,-3.81 -5.339,-3.81 ; -5.839,-2.54 -5.339,-2.54 ; -5.839,-1.27 -5.339,-1.27 ; -5.839,0 -5.339,0 ; -5.839,1.27 -5.339,1.27 ; -5.839,2.54 -5.339,2.54 ; -5.839,3.81 -5.339,3.81 ; -5.339,-4.31 -5.339,-3.81 ; -5.339,-3.31 -5.339,-3.81 ; -5.339,-3.04 -5.339,-2.54 ; -5.339,-2.04 -5.339,-2.54 ; -5.339,-1.77 -5.339,-1.27 ; -5.339,-0.77 -5.339,-1.27 ; -5.339,-0.5 -5.339,0 ; -5.339,0.5 -5.339,0 ; -5.339,0.77 -5.339,1.27 ; -5.339,1.77 -5.339,1.27 ; -5.339,2.04 -5.339,2.54 ; -5.339,3.04 -5.339,2.54 ; -5.339,3.31 -5.339,3.81 ; -5.339,4.31 -5.339,3.81 ; -4.839,-3.81 -5.339,-3.81 ; -4.839,-2.54 -5.339,-2.54 ; -4.839,-1.27 -5.339,-1.27 ; -4.839,0 -5.339,0 ; -4.839,1.27 -5.339,1.27 ; -4.839,2.54 -5.339,2.54 ; -4.839,3.81 -5.339,3.81 ; 1.791,0 2.291,0 ; 2.291,-0.5 2.291,0 ; 2.291,0.5 2.291,0 ; 2.791,0 2.291,0
Mechanical 14:
  lines w0.1: -2.279,-4.16 -6.199,-4.16 -6.199,-3.46 -2.279,-3.46 ; -2.279,-2.89 -6.199,-2.89 -6.199,-2.19 -2.279,-2.19 ; -2.279,-1.62 -6.199,-1.62 -6.199,-0.92 -2.279,-0.92 ; -2.279,-0.35 -6.199,-0.35 -6.199,0.35 -2.279,0.35 ; -2.279,0.92 -6.199,0.92 -6.199,1.62 -2.279,1.62 ; -2.279,2.19 -6.199,2.19 -6.199,2.89 -2.279,2.89 ; -2.279,3.46 -6.199,3.46 -6.199,4.16 -2.279,4.16 ; -2.279,-5.08 7.571,-5.08 7.571,5.08 -2.279,5.08 -2.279,-5.08
Mechanical 15:
  lines w0.05: -0.5,0 0,0 ; 0,-0.5 0,0 ; 0,0.5 0,0 ; 0.5,0 0,0 ; -7.044,-5.58 8.071,-5.58 8.071,5.58 -7.044,5.58 -7.044,-5.58
3D body "TEXAS_TO-PMOD (NDW).stp": height 4.77, standoff 0, extent -6.199,-5.08 7.571,5.08

## TEXAS_W (R-GDFP-F16) [mm] "TEXAS Case Style W(R-GDFP-F16), CFP, 1.27mm Pitch, Ceramic Dual FlatPacka 16 Pins, 6.73mm L X 10.16mm W X 2.03mm H body"
height 2.03
pads (16):
  rect 1.8x0.6 smd: 1(-4.97,4.445) 2(-4.97,3.175) 3(-4.97,1.905) 4(-4.97,0.635) 5(-4.97,-0.635) 6(-4.97,-1.905) 7(-4.97,-3.175) 8(-4.97,-4.445) 9(4.97,-4.445) 10(4.97,-3.175) 11(4.97,-1.905) 12(4.97,-0.635) 13(4.97,0.635) 14(4.97,1.905) 15(4.97,3.175) 16(4.97,4.445)
Keep-Out Layer:
  board cut-out: -3.25,-5.85 -3.369,-5.85 -3.59,-5.759 -3.759,-5.59 -3.85,-5.369 -3.85,-5.25 -3.85,5.25 -3.85,5.369 -3.759,5.59 -3.59,5.759 -3.369,5.85 -3.25,5.85 3.25,5.85 3.369,5.85 3.59,5.759 3.759,5.59 3.85,5.369 3.85,5.25 3.85,-5.25 3.85,-5.369 3.759,-5.59 3.59,-5.759 3.369,-5.85 3.25,-5.85
Mechanical 1:
  lines w0.635: -3.85,-5.25 ccw(c-3.25,-5.25) -3.25,-5.85 3.25,-5.85 ccw(c3.25,-5.25) 3.85,-5.25 3.85,5.25 ccw(c3.25,5.25) 3.25,5.85 -3.25,5.85 ccw(c-3.25,5.25) -3.85,5.25 -3.85,-5.25
Mechanical 8:
  lines w0.1: -5.47,-4.445 -4.97,-4.445 ; -5.47,-3.175 -4.97,-3.175 ; -5.47,-1.905 -4.97,-1.905 ; -5.47,-0.635 -4.97,-0.635 ; -5.47,0.635 -4.97,0.635 ; -5.47,1.905 -4.97,1.905 ; -5.47,3.175 -4.97,3.175 ; -5.47,4.445 -4.97,4.445 ; -4.97,-4.945 -4.97,-4.445 ; -4.97,-3.945 -4.97,-4.445 ; -4.97,-3.675 -4.97,-3.175 ; -4.97,-2.675 -4.97,-3.175 ; -4.97,-2.405 -4.97,-1.905 ; -4.97,-1.405 -4.97,-1.905 ; -4.97,-1.135 -4.97,-0.635 ; -4.97,-0.135 -4.97,-0.635 ; -4.97,0.135 -4.97,0.635 ; -4.97,1.135 -4.97,0.635 ; -4.97,1.405 -4.97,1.905 ; -4.97,2.405 -4.97,1.905 ; -4.97,2.675 -4.97,3.175 ; -4.97,3.675 -4.97,3.175 ; -4.97,3.945 -4.97,4.445 ; -4.97,4.945 -4.97,4.445 ; -4.47,-4.445 -4.97,-4.445 ; -4.47,-3.175 -4.97,-3.175 ; -4.47,-1.905 -4.97,-1.905 ; -4.47,-0.635 -4.97,-0.635 ; -4.47,0.635 -4.97,0.635 ; -4.47,1.905 -4.97,1.905 ; -4.47,3.175 -4.97,3.175 ; -4.47,4.445 -4.97,4.445 ; -0.5,0 0,0 ; 0,-0.5 0,0 ; 0,0.5 0,0 ; 0.5,0 0,0 ; 4.47,-4.445 4.97,-4.445 ; 4.47,-3.175 4.97,-3.175 ; 4.47,-1.905 4.97,-1.905 ; 4.47,-0.635 4.97,-0.635 ; 4.47,0.635 4.97,0.635 ; 4.47,1.905 4.97,1.905 ; 4.47,3.175 4.97,3.175 ; 4.47,4.445 4.97,4.445 ; 4.97,-4.945 4.97,-4.445 ; 4.97,-3.945 4.97,-4.445 ; 4.97,-3.675 4.97,-3.175 ; 4.97,-2.675 4.97,-3.175 ; 4.97,-2.405 4.97,-1.905 ; 4.97,-1.405 4.97,-1.905 ; 4.97,-1.135 4.97,-0.635 ; 4.97,-0.135 4.97,-0.635 ; 4.97,0.135 4.97,0.635 ; 4.97,1.135 4.97,0.635 ; 4.97,1.405 4.97,1.905 ; 4.97,2.405 4.97,1.905 ; 4.97,2.675 4.97,3.175 ; 4.97,3.675 4.97,3.175 ; 4.97,3.945 4.97,4.445 ; 4.97,4.945 4.97,4.445 ; 5.47,-4.445 4.97,-4.445 ; 5.47,-3.175 4.97,-3.175 ; 5.47,-1.905 4.97,-1.905 ; 5.47,-0.635 4.97,-0.635 ; 5.47,0.635 4.97,0.635 ; 5.47,1.905 4.97,1.905 ; 5.47,3.175 4.97,3.175 ; 5.47,4.445 4.97,4.445 ; -5.87,-4.745 -5.87,-4.145 -4.07,-4.145 -4.07,-4.745 -5.87,-4.745 ; -5.87,-3.475 -5.87,-2.875 -4.07,-2.875 -4.07,-3.475 -5.87,-3.475 ; -5.87,-2.205 -5.87,-1.605 -4.07,-1.605 -4.07,-2.205 -5.87,-2.205 ; -5.87,-0.935 -5.87,-0.335 -4.07,-0.335 -4.07,-0.935 -5.87,-0.935 ; -5.87,0.335 -5.87,0.935 -4.07,0.935 -4.07,0.335 -5.87,0.335 ; -5.87,1.605 -5.87,2.205 -4.07,2.205 -4.07,1.605 -5.87,1.605 ; -5.87,2.875 -5.87,3.475 -4.07,3.475 -4.07,2.875 -5.87,2.875 ; -5.87,4.145 -5.87,4.745 -4.07,4.745 -4.07,4.145 -5.87,4.145 ; 4.07,-4.745 4.07,-4.145 5.87,-4.145 5.87,-4.745 4.07,-4.745 ; 4.07,-3.475 4.07,-2.875 5.87,-2.875 5.87,-3.475 4.07,-3.475 ; 4.07,-2.205 4.07,-1.605 5.87,-1.605 5.87,-2.205 4.07,-2.205 ; 4.07,-0.935 4.07,-0.335 5.87,-0.335 5.87,-0.935 4.07,-0.935 ; 4.07,0.335 4.07,0.935 5.87,0.935 5.87,0.335 4.07,0.335 ; 4.07,1.605 4.07,2.205 5.87,2.205 5.87,1.605 4.07,1.605 ; 4.07,2.875 4.07,3.475 5.87,3.475 5.87,2.875 4.07,2.875 ; 4.07,4.145 4.07,4.745 5.87,4.745 5.87,4.145 4.07,4.145
Drill Drawing:
  lines w0.1: -2.91,1.658 -3.85,2 ; -2.91,2.342 -3.85,2 ; -1.942,-4.91 -1.6,-5.85 ; -1.942,4.91 -1.6,5.85 ; -1.258,-4.91 -1.6,-5.85 ; -1.258,4.91 -1.6,5.85 ; -0.511,-4.223 2.223,-4.223 3.674,-5.674 ; -0.5,0 0,0 ; 0,-0.5 0,0 ; 0,0.5 0,0 ; 0.5,0 0,0 ; 2.768,-5.252 3.674,-5.674 ; 2.92,1.658 3.86,2 ; 2.92,2.342 3.86,2 ; 3.252,-4.768 3.674,-5.674 ; -3.85,2 3.86,2 ; -1.6,-5.85 -1.6,5.85 ; -3.85,-5.25 ccw(c-3.25,-5.25) -3.25,-5.85 3.25,-5.85 ccw(c3.25,-5.25) 3.85,-5.25 3.85,5.25 ccw(c3.25,5.25) 3.25,5.85 -3.25,5.85 ccw(c-3.25,5.25) -3.85,5.25 -3.85,-5.25
  text "7.7" at 0.283,2.209 h1
  text "r0.6" at -0.267,-4.014 h1
  text "11.7" at -1.809,-3.08 h1
3D body "TEXAS_W (R-GDFP-F16).stp": height 1.09, standoff -0.94, extent -5.32,-5.46 5.32,5.46

## TO127P1394X457-8N-R789X1054 [mm] "TO-263, 7 Leads, 1.70mm pitch; TO, 13.945mm L X 8.89mm W X 4.57mm H body IPC Medium Density"
height 4.57
pads (8):
  rect 2.95x1 smd: 1(-6.3,3.81) 2(-6.3,2.54) 3(-6.3,1.27) 4(-6.3,0) 5(-6.3,-1.27) 6(-6.3,-2.54) 7(-6.3,-3.81)
  rect 9x10.6 smd: 8(3.3,0)
Top Overlay:
  circle w0.25: c-7.5,4.85 r0.125
  lines w0.2: -1.55,-5.1 -4.45,-5.1 -4.45,5.1 -1.55,5.1
Top Paste:
  region: -0.5,-4.7 0.86,-4.7 0.86,-3.3 -0.5,-3.3
  region: 1.58,-4.7 2.94,-4.7 2.94,-3.3 1.58,-3.3
  region: 3.66,-4.7 5.02,-4.7 5.02,-3.3 3.66,-3.3
  region: 5.74,-4.7 7.1,-4.7 7.1,-3.3 5.74,-3.3
  region: -0.5,-2.7 0.86,-2.7 0.86,-1.3 -0.5,-1.3
  region: 1.58,-2.7 2.94,-2.7 2.94,-1.3 1.58,-1.3
  region: 3.66,-2.7 5.02,-2.7 5.02,-1.3 3.66,-1.3
  region: 5.74,-2.7 7.1,-2.7 7.1,-1.3 5.74,-1.3
  region: -0.5,-0.7 0.86,-0.7 0.86,0.7 -0.5,0.7
  region: 1.58,-0.7 2.94,-0.7 2.94,0.7 1.58,0.7
  region: 3.66,-0.7 5.02,-0.7 5.02,0.7 3.66,0.7
  region: 5.74,-0.7 7.1,-0.7 7.1,0.7 5.74,0.7
  region: -0.5,1.3 0.86,1.3 0.86,2.7 -0.5,2.7
  region: 1.58,1.3 2.94,1.3 2.94,2.7 1.58,2.7
  region: 3.66,1.3 5.02,1.3 5.02,2.7 3.66,2.7
  region: 5.74,1.3 7.1,1.3 7.1,2.7 5.74,2.7
  region: -0.5,3.3 0.86,3.3 0.86,4.7 -0.5,4.7
  region: 1.58,3.3 2.94,3.3 2.94,4.7 1.58,4.7
  region: 3.66,3.3 5.02,3.3 5.02,4.7 3.66,4.7
  region: 5.74,3.3 7.1,3.3 7.1,4.7 5.74,4.7
Mechanical 14:
  lines w0.1: 5.452,-5.112 5.954,-5.112 6.972,-3.984 6.972,3.985 5.954,5.113 5.452,5.113 ; -3.438,-5.11 5.453,-5.11 5.453,5.11 -3.438,5.11 -3.438,-5.11
Mechanical 15:
  lines w0.05: -0.5,0 0.5,0 ; 0,-0.5 0,0.5 ; -8.05,-5.55 8.05,-5.55 8.05,5.55 -8.05,5.55 -8.05,-5.55
3D body "TO127P1394X457-8N-R789X1054.stp": height 4.57, standoff 0, extent -7.068,-5.27 7.486,5.271

## TO127P1410X464-8N-1030X1050 [mm] "TO-263, TO,1.27mm pitch;7 pin,14.10mm L X 8.64mm W X 4.64mm H body, IPC Medium Density"
height 4.64
pads (8):
  rect 3x0.9 smd: 1(-6.05,3.81) 2(-6.05,2.54) 3(-6.05,1.27) 4(-6.05,0) 5(-6.05,-1.27) 6(-6.05,-2.54) 7(-6.05,-3.81)
  rect 10.3x10.5 smd: 8(2.4,0)
Top Overlay:
  circle w0.25: c-7.3,4.8 r0.125
  lines w0.2: -3.1,-5.1 -4.2,-5.1 -4.2,5.1 -3.1,5.1
Top Paste:
  region: 5.16,3.29 6.78,3.29 6.78,4.63 5.16,4.63
  region: 2.78,3.29 4.4,3.29 4.4,4.63 2.78,4.63
  region: 0.4,3.29 2.02,3.29 2.02,4.63 0.4,4.63
  region: -1.98,3.29 -0.36,3.29 -0.36,4.63 -1.98,4.63
  region: 5.16,1.31 6.78,1.31 6.78,2.65 5.16,2.65
  region: 2.78,1.31 4.4,1.31 4.4,2.65 2.78,2.65
  region: 0.4,1.31 2.02,1.31 2.02,2.65 0.4,2.65
  region: -1.98,1.31 -0.36,1.31 -0.36,2.65 -1.98,2.65
  region: 5.16,-0.67 6.78,-0.67 6.78,0.67 5.16,0.67
  region: 2.78,-0.67 4.4,-0.67 4.4,0.67 2.78,0.67
  region: 0.4,-0.67 2.02,-0.67 2.02,0.67 0.4,0.67
  region: -1.98,-0.67 -0.36,-0.67 -0.36,0.67 -1.98,0.67
  region: 5.16,-2.65 6.78,-2.65 6.78,-1.31 5.16,-1.31
  region: 2.78,-2.65 4.4,-2.65 4.4,-1.31 2.78,-1.31
  region: 0.4,-2.65 2.02,-2.65 2.02,-1.31 0.4,-1.31
  region: -1.98,-2.65 -0.36,-2.65 -0.36,-1.31 -1.98,-1.31
  region: 5.16,-4.63 6.78,-4.63 6.78,-3.29 5.16,-3.29
  region: 2.78,-4.63 4.4,-4.63 4.4,-3.29 2.78,-3.29
  region: 0.4,-4.63 2.02,-4.63 2.02,-3.29 0.4,-3.29
  region: -1.98,-4.63 -0.36,-4.63 -0.36,-3.29 -1.98,-3.29
Mechanical 14:
  lines w0.1: 5.78,-5.112 6.199,-5.112 7.05,-4.17 7.05,4.17 6.199,5.112 5.78,5.112 ; -2.86,-5.08 -2.86,5.08 5.78,5.08 5.78,-5.08 -2.86,-5.08
Mechanical 15:
  circle w0.05: c0,0 r0.35
  lines w0.05: -0.5,0 0.5,0 ; 0,-0.5 0,0.5 ; -7.8,-5.5 -7.8,5.5 7.8,5.5 7.8,-5.5 -7.8,-5.5
3D body "TO127P1410X464-8N-1030X1050.stp": height 4.57, standoff 0, extent -7.124,-5.08 7.232,5.08